# Altium footprint library B105rlc.PcbLib: 103 footprints (part 2 of 7)
Each footprint in its own frame and in the unit in brackets; x right, y up, seen from the top. Pads: shape width x height; smd on the part's side, far side on the other; paste and mask are expansions set on the pad; w line width, h text height; cw(c..) or ccw(c..) is an arc to the next point about the centre after c.
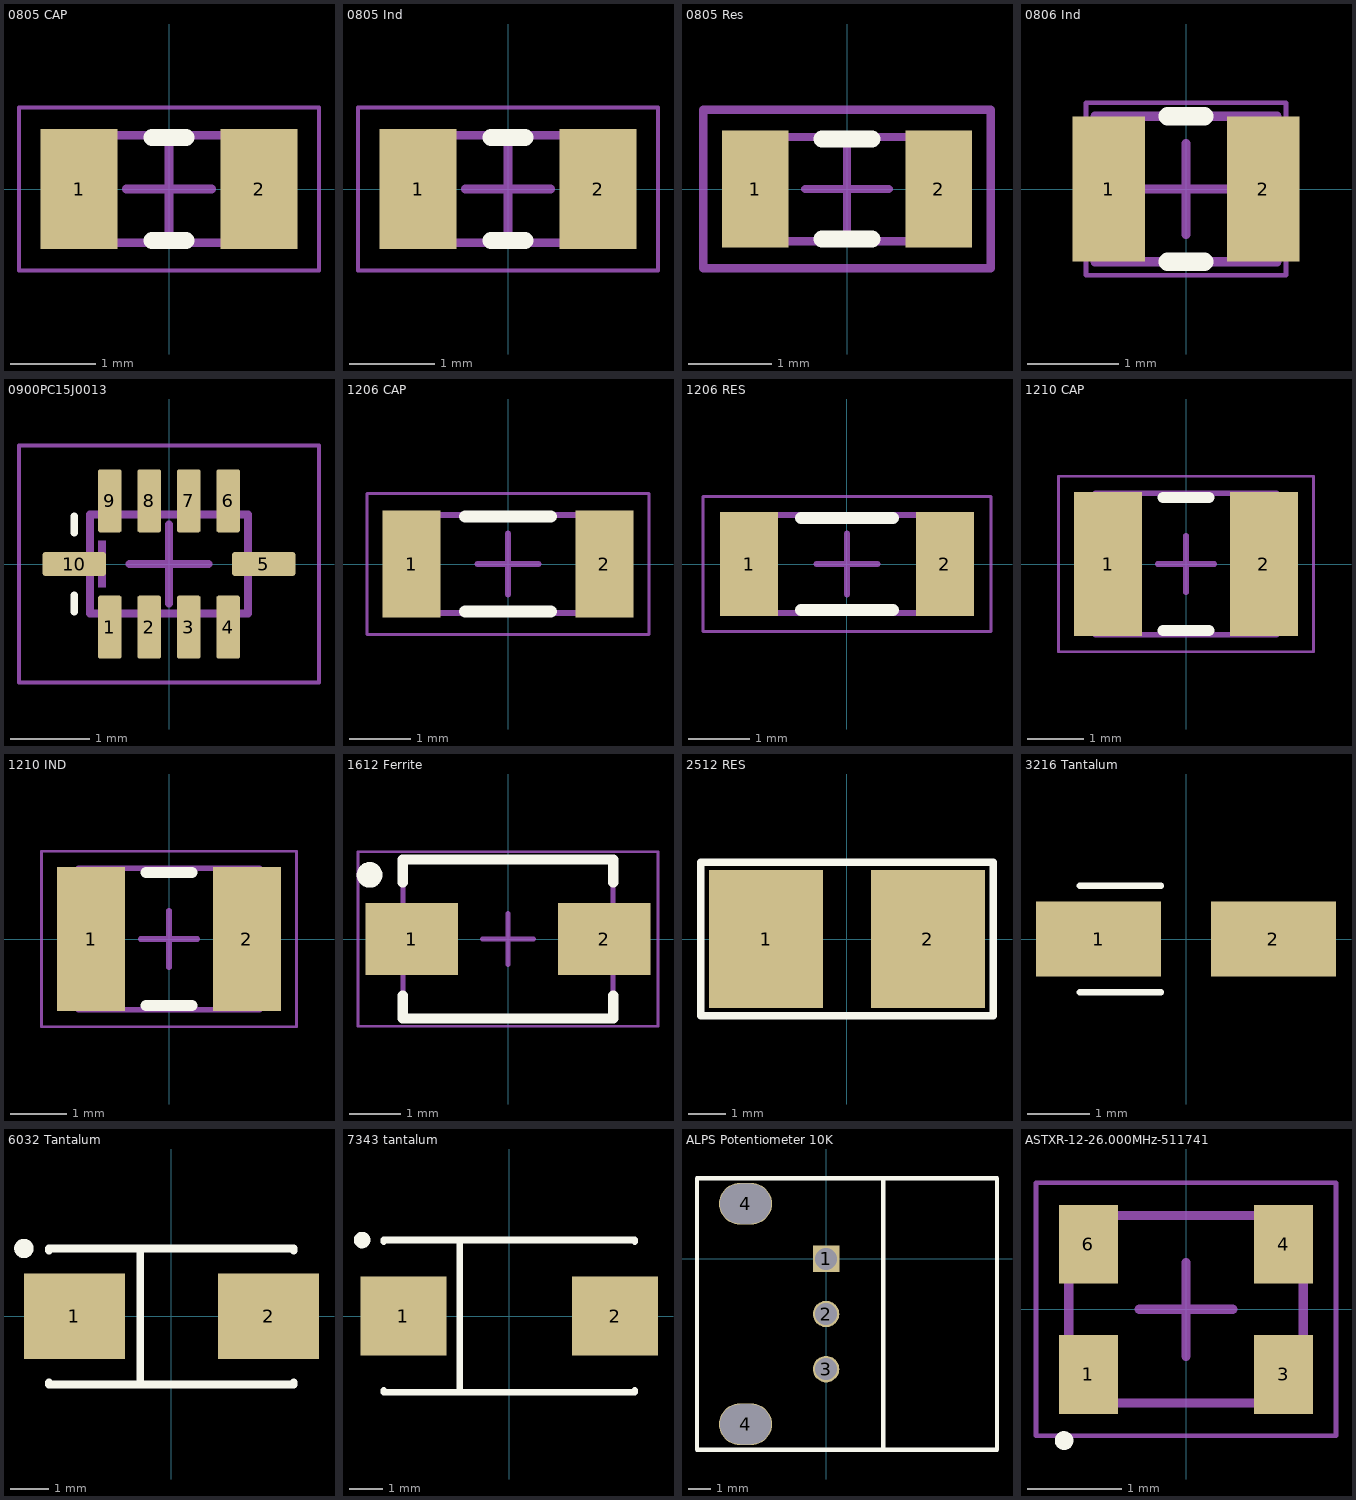
[diagram p1: the footprints below, top view; thin cyan lines are the x and y axes]

## 0805 CAP [mm] "Chip Capacitor, 2-Leads, Body 2,00x1,25mm, IPC Medium Density"
height 0.6
pads (2):
  rect 0.9x1.4 smd: 1(-1.05,0) 2(1.05,0)
Top Overlay:
  lines w0.2: -0.2,-0.6 0.2,-0.6 ; -0.2,0.6 0.2,0.6
Mechanical 13:
  lines w0.1: -1,-0.625 -1,0.625 1,0.625 1,-0.625 -1,-0.625
Mechanical 15:
  lines w0.05: -1.75,-0.95 -1.75,0.95 1.75,0.95 1.75,-0.95 -1.75,-0.95
  lines w0.1: -0.5,0 0.5,0 ; 0,-0.5 0,0.5
3D body "cap_0805-1.step": height 1.2, standoff 0, extent -1,-0.6 1,0.6

## 0805 Ind [mm] "Chip Capacitor, 2-Leads, Body 2,00x1,25mm, IPC Medium Density"
height 0.6
pads (2):
  rect 0.9x1.4 smd: 1(-1.05,0) 2(1.05,0)
Top Overlay:
  lines w0.2: -0.2,-0.6 0.2,-0.6 ; -0.2,0.6 0.2,0.6
Mechanical 13:
  lines w0.1: -1,-0.625 -1,0.625 1,0.625 1,-0.625 -1,-0.625
Mechanical 15:
  lines w0.05: -1.75,-0.95 -1.75,0.95 1.75,0.95 1.75,-0.95 -1.75,-0.95
  lines w0.1: -0.5,0 0.5,0 ; 0,-0.5 0,0.5
3D body "ind_0805.step": height 0.95, standoff 0, extent -1,-0.6 1,0.6

## 0805 Res [mm] "Chip Capacitor, 2-Leads, Body 2,0x1,3mm, IPC Medium Density"
height 0.8
pads (2):
  rect 0.8x1.4 smd: 1(-1.1,0) 2(1.1,0)
Top Overlay:
  lines w0.2: -0.3,-0.6 0.3,-0.6 ; -0.3,0.6 0.3,0.6
Mechanical 13:
  lines w0.1: -1,-0.625 1,-0.625 1,0.625 -1,0.625 -1,-0.625
Mechanical 15:
  lines w0.1: -0.5,0 0.5,0 ; 0,-0.5 0,0.5 ; -1.725,-0.95 1.725,-0.95 1.725,0.95 -1.725,0.95 -1.725,-0.95
3D body "User Library-RESC2012X05N 0805.step": height 0.44, standoff -0.02, extent -1,-0.625 1,0.625

## 0806 Ind [mm] "Chip Inductor, 2-Leads, Body 2,00x1,6mm, IPC Medium Density"
height 1
pads (2):
  rect 0.8x1.6 smd: 1(-0.85,0) 2(0.85,0)
Top Overlay:
  lines w0.2: -0.2,-0.8 0.2,-0.8 ; -0.2,0.8 0.2,0.8
Mechanical 13:
  lines w0.1: -1,-0.8 -1,0.8 1,0.8 1,-0.8 -1,-0.8
Mechanical 15:
  lines w0.05: -1.1,-0.95 -1.1,0.95 1.1,0.95 1.1,-0.95 -1.1,-0.95
  lines w0.1: -0.5,0 0.5,0 ; 0,-0.5 0,0.5
3D body "SRP2010 series.stp": height 1, standoff 0, extent -1,-0.8 1,0.8

## 0900PC15J0013 [mm]
pads (10):
  rrect20% 0.3x0.8 smd: 1(-0.75,-0.8) 2(-0.25,-0.8) 3(0.25,-0.8) 4(0.75,-0.8) 6(0.75,0.8) 7(0.25,0.8) 8(-0.25,0.8) 9(-0.75,0.8)
  rrect20% 0.8x0.3 smd: 5(1.2,0) 10(-1.2,0)
Top Overlay:
  lines w0.1: -1.2,-0.6 -1.2,-0.4 ; -1.2,0.4 -1.2,0.6
Mechanical 5:
  rectangle: -0.9,-0.3 -0.8,0.3
  lines w0.05: -1,-0.6 -1,0.6 1,0.6 1,-0.6 -1,-0.6
  text ".Designator" at -0.3,-0.3 h0.64
Mechanical 13:
  lines w0.1: -1,-0.625 1,-0.625 ; -1,-0.6 -1,0.6 ; -1,0.625 1,0.625 ; 1,-0.6 1,0.6
Mechanical 15:
  lines w0.05: -1.9,-1.5 -1.9,1.5 1.9,1.5 1.9,-1.5 -1.9,-1.5
  lines w0.1: -0.5,0 0.5,0 ; 0,-0.5 0,0.5
3D body: height 0.95, standoff 0, extent -1,-0.625 1,0.625
3D body: height 1, standoff 0, extent -0.9,-0.625 -0.6,-0.4
3D body: height 1, standoff 0, extent -0.4,-0.625 -0.1,-0.4
3D body: height 1, standoff 0, extent 0.1,-0.625 0.4,-0.4
3D body: height 1, standoff 0, extent 0.6,-0.625 0.9,-0.4
3D body: height 1, standoff 0, extent 0.6,0.4 0.9,0.625
3D body: height 1, standoff 0, extent 0.1,0.4 0.4,0.625
3D body: height 1, standoff 0, extent -0.4,0.4 -0.1,0.625
3D body: height 1, standoff 0, extent -0.9,0.4 -0.6,0.625
3D body: height 1, standoff 0, extent -1,-0.2 -0.8,0.2
3D body: height 1, standoff 0, extent 0.8,-0.2 1,0.2
3D body: height 1, standoff 0, extent -0.7,-0.2 -0.2,0.2

## 1206 CAP [mm] "Chip Capacitor, 2-Leads, Body 3,20x1,60mm, IPC Medium Density"
height 0.6
pads (2):
  rect 0.95x1.75 smd: 1(-1.575,0) 2(1.575,0)
Top Overlay:
  lines w0.2: -0.7,-0.775 0.7,-0.775 ; -0.7,0.775 0.7,0.775
Mechanical 13:
  lines w0.1: -1.6,-0.8 1.6,-0.8 1.6,0.8 -1.6,0.8 -1.6,-0.8
Mechanical 15:
  lines w0.05: -2.3,-1.15 2.3,-1.15 2.3,1.15 -2.3,1.15 -2.3,-1.15
  lines w0.1: -0.5,0 0.5,0 ; 0,-0.5 0,0.5
3D body "cap_1206-1.step": height 1.6, standoff 0, extent -1.6,-0.788 1.6,0.812

## 1206 RES [mm] "Chip Resistor, 2-Leads, Body 3,20x1,60mm, IPC Medium Density"
height 0.6
pads (2):
  rect 0.95x1.7 smd: 1(-1.6,0) 2(1.6,0)
Top Overlay:
  lines w0.2: -0.75,-0.75 0.75,-0.75 ; -0.75,0.75 0.75,0.75
Mechanical 13:
  lines w0.1: -1.6,-0.8 -1.6,0.8 1.6,0.8 1.6,-0.8 -1.6,-0.8
Mechanical 15:
  lines w0.05: -2.35,-1.1 -2.35,1.1 2.35,1.1 2.35,-1.1 -2.35,-1.1
  lines w0.1: -0.5,0 0.5,0 ; 0,-0.5 0,0.5
3D body "1206 SMD Resistor.step": height 1, standoff 0, extent -1.6,-0.8 1.6,0.8

## 1210 CAP [mm] "Chip Capacitor, 2-Leads, Body 3,20x2,50mm, IPC Medium Density"
height 2.5
pads (2):
  rect 1.2x2.55 smd: 1(-1.375,0) 2(1.375,0)
Top Overlay:
  lines w0.2: -0.4,-1.175 0.4,-1.175 ; -0.4,1.175 0.4,1.175
Mechanical 13:
  lines w0.1: -1.6,-1.25 1.6,-1.25 1.6,1.25 -1.6,1.25 -1.6,-1.25
Mechanical 15:
  lines w0.05: -2.25,-1.55 2.25,-1.55 2.25,1.55 -2.25,1.55 -2.25,-1.55
  lines w0.1: -0.5,0 0.5,0 ; 0,-0.5 0,0.5
3D body: height 2.5, standoff 0, extent 0.8,-1.25 1.6,1.25
3D body: height 2.5, standoff 0, extent -1.6,-1.25 -0.8,1.25
3D body "cap_1210.step": height 2.5, standoff 0, extent -1.6,-1.25 1.6,1.25

## 1210 IND [mm] "Chip Capacitor, 2-Leads, Body 3,20x2,50mm, IPC Medium Density"
height 2.5
pads (2):
  rect 1.2x2.55 smd: 1(-1.375,0) 2(1.375,0)
Top Overlay:
  lines w0.2: -0.4,-1.175 0.4,-1.175 ; -0.4,1.175 0.4,1.175
Mechanical 13:
  lines w0.1: -1.6,-1.25 1.6,-1.25 1.6,1.25 -1.6,1.25 -1.6,-1.25
Mechanical 15:
  lines w0.05: -2.25,-1.55 2.25,-1.55 2.25,1.55 -2.25,1.55 -2.25,-1.55
  lines w0.1: -0.5,0 0.5,0 ; 0,-0.5 0,0.5
3D body "User Library-CBC3225.step": height 2.5, standoff 0, extent -1.65,-1.25 1.55,1.25

## 1612 Ferrite [mm]
height 3
pads (2):
  rect 1.8x1.4 smd: 1(-1.875,0) 2(1.875,0)
Top Overlay:
  circle w0.25: c-2.7,1.25 r0.125
  lines w0.2: -2.05,-1.1 -2.05,-1.55 2.05,-1.55 2.05,-1.1 ; -2.05,1.1 -2.05,1.55 2.05,1.55 2.05,1.1
Mechanical 13:
  lines w0.1: -2.05,-1.55 -2.05,1.55 2.05,1.55 2.05,-1.55 -2.05,-1.55
Mechanical 15:
  lines w0.05: -2.925,-1.7 -2.925,1.7 2.925,1.7 2.925,-1.7 -2.925,-1.7
  lines w0.1: -0.5,0 0.5,0 ; 0,-0.5 0,0.5
3D body "Ferrite Bead 1612.stp": height 2.78, standoff 0.02, extent -2.2,-1.5 2.2,1.5

## 2512 RES [mm]
pads (2):
  rect 3.05x3.68 smd: 1(-2.16,0) 2(2.16,0)
Top Overlay:
  lines w0.2: -3.895,-2.05 3.895,-2.05 3.895,2.05 -3.895,2.05 -3.895,-2.05
3D body "2512 RES.STEP": height 0.6, standoff 0, extent -3.2,-1.6 3.2,1.6

## 3216 Tantalum [mm] "Capacitor, SM Tantalum; Body 3.2 x 1.6 mm (LxW typ)"
height 1.8
pads (2):
  rect 2x1.2 smd: 1(-1.4,0) 2(1.4,0)
Top Overlay:
  lines w0.1: -1.7,-0.85 -0.4,-0.85 ; -1.7,0.85 -0.4,0.85
3D body: height 1, standoff 0, extent 1.559,-0.5 1.75,0.5
3D body: height 1, standoff 0, extent -1.75,-0.5 -1.56,0.5
3D body: height 1.6, standoff 0, extent -1.6,-0.8 1.6,0.8
3D body: height 1.65, standoff 0, extent -1.329,-0.75 -1.075,0.75

## 6032 Tantalum [mm] "Capacitor, SM Tantalum; Body 6.0 x 3.2 mm (LxW typ)"
height 2.8
pads (2):
  rect 2.6x2.2 smd: 1(-2.5,0) 2(2.5,0)
Top Overlay:
  circle w0.25: c-3.8,1.75 r0.125
  lines w0.2: -3.15,-1.7 -3.15,-1.75 3.15,-1.75 3.15,-1.7 ; -3.15,1.7 -3.15,1.75 3.15,1.75 3.15,1.7 ; -0.8,-1.75 -0.8,1.75
3D body: height 2.55, standoff 0, extent -2.708,-1.5 -1.692,1.5
3D body: height 2.5, standoff 0, extent -3,-1.6 3,1.6
3D body: height 1, standoff 0, extent -3.165,-1 -2.784,1
3D body: height 1, standoff 0, extent 2.785,-1 3.166,1

## 7343 tantalum [mm] "Capacitor, SM Tantalum; Body 7.3 x 4.3 mm (LxW typ)"
height 4.3
pads (2):
  rect 2.6x2.4 smd: 1(-3.2,0) 2(3.2,0)
Top Overlay:
  circle w0.25: c-4.45,2.3 r0.125
  lines w0.2: -3.8,-2.25 -3.8,-2.3 3.8,-2.3 3.8,-2.25 ; -3.8,2.25 -3.8,2.3 3.8,2.3 3.8,2.25 ; -1.5,-2.3 -1.5,2.3
3D body: height 1, standoff 0, extent 3.429,-1.27 3.81,1.27
3D body: height 1, standoff 0, extent -3.81,-1.27 -3.429,1.27
3D body: height 4, standoff 0, extent -3.556,-2.159 3.556,2.159
3D body: height 4.05, standoff 0, extent -3.302,-2.032 -2.286,2.032

## ALPS Potentiometer 10K [mm]
pads (5):
  rect 1.2x1.2 hole 1: 1(0,0)
  round 1.2 hole 1: 2(0,-2.5) 3(0,-5)
  oval 2.4x1.9 hole 1.8 slot 2.3 at 0 deg: 4(-3.65,-7.5) 4(-3.65,2.5)
Top Overlay:
  lines w0.2: 2.6,-8.65 2.6,3.65 ; 2.6,-8.65 -5.85,-8.65 -5.85,3.65 2.6,3.65 ; 2.6,-8.65 7.75,-8.65 7.75,3.65 2.6,3.65
3D body "ALPS-POTENTIOMETER_rk09l1120a2s.stp": height 11.85, standoff -3, extent -5.75,-8.55 19.95,3.55

## ASTXR-12-26.000MHz-511741 [mm] "26MHz TCXO, 1.8V, Clipped sine wave 10KOhm/10pF, 2.5 x 2.0 x 0.8 mm SMD"
height 0.9
pads (4):
  rect 0.63x0.84 smd: 1(-1.04,-0.695) 3(1.04,-0.695) 4(1.04,0.695) 6(-1.04,0.695)
Top Overlay:
  circle w0.1: c-1.3,-1.4 r0.05
Mechanical 13:
  lines w0.1: -1.25,-1 1.25,-1 1.25,1 -1.25,1 -1.25,-1
Mechanical 15:
  lines w0.05: -1.6,-1.35 1.6,-1.35 1.6,1.35 -1.6,1.35 -1.6,-1.35
  lines w0.1: -0.5,0 0.5,0 ; 0,-0.5 0,0.5
3D body "ASTXR-12-26.000MHz-511741.step": height 0.82, standoff 0, extent -1.25,-1 1.25,1